# Altium footprint library MercurialSDR.PcbLib: 77 footprints (part 2 of 5)
Each footprint in its own frame and in the unit in brackets; x right, y up, seen from the top. Pads: shape width x height; smd on the part's side, far side on the other; paste and mask are expansions set on the pad; w line width, h text height; cw(c..) or ccw(c..) is an arc to the next point about the centre after c.
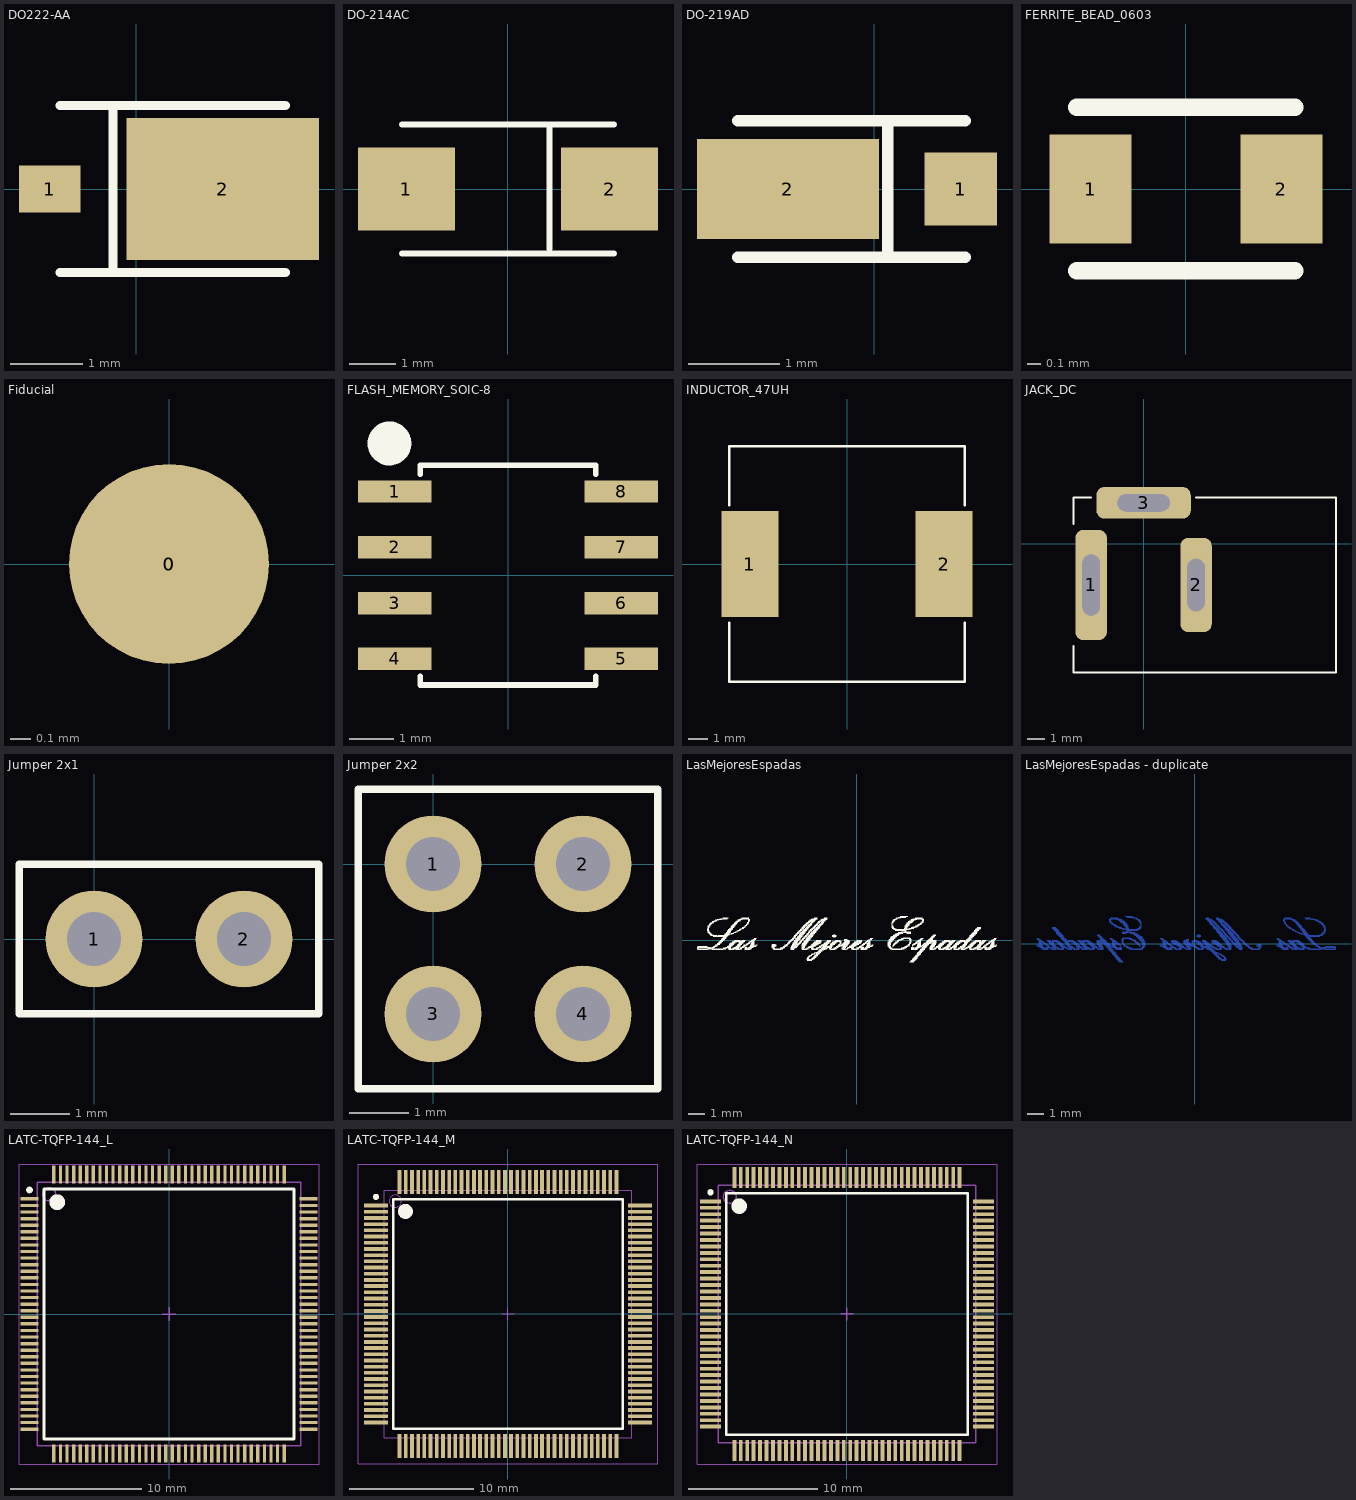
[diagram p1: the footprints below, top view; thin cyan lines are the x and y axes]

## DO222-AA [mm] "Diodo Schottky STPS1L20MF"
pads (2):
  rect 0.85x0.65 smd: 1(-1.19,0)
  rect 2.65x1.95 smd: 2(1.19,0)
Top Overlay:
  lines w0.127: -1.05,-1.15 2.05,-1.15 ; -1.05,1.15 2.05,1.15 ; -0.32,-1.14 -0.32,1.15
3D body "User Library-Diodoshcottkey-DO216-AA.step": height 0.85, standoff 0, extent -1.44,-0.954 2.36,0.955

## DO-214AC [mm] "TVS SMD"
pads (2):
  rect 2.1x1.8 smd: 1(-2.2,0) 2(2.2,0)
Top Overlay:
  lines w0.127: -2.3,-1.4 2.3,-1.4 ; -2.3,1.4 2.3,1.4 ; 0.9,-1.3 0.9,1.4
3D body "User Library-TVS-DO-214AC(SMA).step": height 1.14, standoff -1.14, extent -2.643,-1.397 2.843,1.397

## DO-219AD [mm]
pads (2):
  rect 0.8x0.8 smd: 1(0.95,0)
  rect 2x1.1 smd: 2(-0.95,0)
Top Overlay:
  lines w0.127: -1.5,-0.75 -0.95,-0.75 0.15,-0.75 ; -1.5,0.75 -0.95,0.75 0.15,0.75 ; 1,-0.75 0.15,-0.75 ; 1,0.75 0.15,0.75 ; 0.15,-0.75 0.15,0.75
3D body "User Library-Diodo schottkey MicroSMP-1.STEP": height 0.71, standoff 0.03, extent -1.5,-0.65 1,0.65

## FERRITE_BEAD_0603 [mm] "Ferrite bead 0603"
pads (2):
  rect 0.6x0.8 smd: 1(-0.7,0) 2(0.7,0)
Top Overlay:
  lines w0.127: -0.8,-0.6 0.8,-0.6 ; -0.8,0.6 0.8,0.6
3D body "User Library-FB_1608-1.STEP": height 0.8, standoff 0, extent -0.8,-0.4 0.8,0.4

## Fiducial [mm]
pads (2):
  round 1.5 on Top Solder: 0(0,0)
  round 1 smd: 0(0,0)

## FLASH_MEMORY_SOIC-8 [mm] "Memoria Flash 256kb SOIC-8"
pads (8):
  rect 1.67x0.51 smd: 1(-2.58,1.905) 2(-2.58,0.635) 3(-2.58,-0.635) 4(-2.58,-1.905) 5(2.58,-1.905) 6(2.58,-0.635) 7(2.58,0.635) 8(2.58,1.905)
Top Overlay:
  circle w0.5: c-2.7,3 r0.25
  lines w0.127: -2,-2.3 -2,-2.5 2,-2.5 2,-2.3 ; -2,2.3 -2,2.5 2,2.5 2,2.3
3D body "User Library-PIC16LF18313-SOIC-8.step": height 1.75, standoff 0, extent -2.88,-2.445 3.12,2.455

## INDUCTOR_47UH [mm] "Inductor SMD 47uH"
pads (2):
  rect 2.9x5.4 smd: 1(-4.95,0) 2(4.95,0)
Top Overlay:
  lines w0.127: -6,-3 -6,-6 6,-6 6,-3 ; -6,3 -6,6 6,6 6,3
3D body "Inductor_47uh.stp": height 7.5, standoff 0, extent -6.35,-6.25 6.15,6.25

## JACK_DC [mm] "Conector DC"
pads (3):
  rrect50% 1.8x6.3 hole 1 slot 3.5 at 90 deg unplated: 1(-3,-2.35)
  rrect50% 1.8x5.4 hole 1 slot 3 at 90 deg unplated: 2(3,-2.35)
  rrect50% 5.4x1.8 hole 1 slot 3 at 0 deg unplated: 3(0,2.35)
Top Overlay:
  lines w0.127: -4,-5.85 -4,-7.35 11,-7.35 11,2.65 3,2.65 ; -4,1.15 -4,2.65 -3,2.65
3D body "User Library-Conector DC jack.stp": height 11.5, standoff -3, extent -3.7,-6.85 10.7,2.55

## Jumper 2x1 [mm] "Jumper 2x1"
pads (2):
  round 1.64 hole 0.91: 1(0,0) 2(2.54,0)
Top Overlay:
  lines w0.127: -1.27,-1.27 3.81,-1.27 3.81,1.27 -1.27,1.27 -1.27,-1.27
3D body "User Library-Jumper SL2.STEP": height 9.5, standoff -2.6, extent -1.23,-1.27 3.77,1.27

## Jumper 2x2 [mm] "Jumper 2x2"
pads (4):
  round 1.64 hole 0.91: 1(0,0) 2(2.54,0) 3(0,-2.54) 4(2.54,-2.54)
Top Overlay:
  lines w0.127: -1.27,-3.81 0,-3.81 2.54,-3.81 3.81,-3.81 3.81,1.27 -1.27,1.27 -1.27,-3.81
3D body "User Library-Jumper SL2.STEP": height 9.5, standoff -2.6, extent -1.23,-3.81 3.77,-1.27
3D body "User Library-Jumper SL2.STEP": height 9.5, standoff -2.6, extent -1.23,-1.27 3.77,1.27

## LasMejoresEspadas [mm]
Top Overlay:
  drawing of 752 lines, arcs and shapes, not listed

## LasMejoresEspadas - duplicate [mm]
Bottom Layer:
  lines w0.044: -9.634,-0.067 -9.545,-0.067 ; -9.59,-0.111 -9.234,-0.111 ; -9.59,0.333 -9.457,0.333 ; -9.545,-0.156 -9.19,-0.156 ; -9.545,0.289 -9.412,0.289 ; -9.501,0.244 -9.323,0.244 ; -9.457,-0.067 -9.234,-0.067 ; -9.457,-0.022 -9.279,-0.022 ; -9.457,0.022 -9.279,0.022 ; -9.457,0.067 -9.323,0.067 ; -9.457,0.111 -9.145,0.111 ; -9.457,0.156 -9.19,0.156 ; -9.457,0.2 -9.279,0.2 ; -9.412,-0.2 -9.145,-0.2 ; -9.323,-0.245 -9.101,-0.245 ; -9.279,-0.289 -8.879,-0.289 ; -9.234,0.067 -9.101,0.067 ; -9.19,-0.333 -8.879,-0.333 ; -9.19,0.022 -9.012,0.022 ; -9.101,-0.022 -8.968,-0.022 ; -9.057,-0.245 -8.879,-0.245 ; -9.057,-0.2 -8.701,-0.2 ; -9.057,-0.067 -8.879,-0.067 ; -8.968,-0.111 -8.834,-0.111 ; -8.968,0.2 -8.745,0.2 ; -8.923,-0.156 -8.79,-0.156 ; -8.923,0.156 -8.701,0.156 ; -8.879,0.111 -8.568,0.111 ; -8.834,0.067 -8.568,0.067 ; -8.79,-0.245 -8.656,-0.245 ; -8.79,0.022 -8.568,0.022 ; -8.745,-0.289 -8.39,-0.289 ; -8.745,-0.022 -8.523,-0.022 ; -8.701,-0.067 -8.479,-0.067 ; -8.656,-0.333 -8.39,-0.333 ; -8.656,-0.156 -8.39,-0.156 ; -8.656,-0.111 -8.434,-0.111 ; -8.656,0.156 -8.212,0.156 ; -8.656,0.2 -8.301,0.2 ; -8.656,0.956 -8.39,0.956 ; -8.656,1 -8.434,1 ; -8.612,-0.2 -8.301,-0.2 ; -8.612,0.911 -8.345,0.911 ; -8.568,-0.245 -8.212,-0.245 ; -8.568,0.867 -8.301,0.867 ; -8.523,0.822 -8.256,0.822 ; -8.479,0.778 -8.256,0.778 ; -8.434,0.111 -8.168,0.111 ; -8.434,0.733 -8.212,0.733 ; -8.39,0.644 -8.123,0.644 ; -8.39,0.689 -8.168,0.689 ; -8.345,-0.289 -7.945,-0.289 ; -8.345,0.067 -8.079,0.067 ; -8.345,0.6 -8.079,0.6 ; -8.301,0.022 -8.034,0.022 ; -8.301,0.556 -8.034,0.556 ; -8.256,-0.333 -7.99,-0.333 ; -8.256,-0.022 -7.99,-0.022 ; -8.256,0.511 -7.99,0.511 ; -8.212,-0.067 -7.99,-0.067 ; -8.212,0.467 -7.99,0.467 ; -8.168,-0.111 -7.901,-0.111 ; -8.168,0.422 -7.945,0.422 ; -8.123,-0.156 -7.856,-0.156 ; -8.123,0.378 -7.901,0.378 ; -8.079,-0.245 -7.945,-0.245 ; -8.079,-0.2 -7.767,-0.2 ; -8.079,0.289 -7.812,0.289 ; -8.079,0.333 -7.856,0.333 ; -8.034,0.244 -7.767,0.244 ; -7.99,0.2 -7.723,0.2 ; -7.945,0.156 -7.279,0.156 ; -7.901,0.111 -7.634,0.111 ; -7.856,-0.245 -7.679,-0.245 ; -7.856,0.067 -7.634,0.067 ; -7.812,-0.022 -7.59,-0.022 ; -7.812,0.022 -7.634,0.022 ; -7.767,-0.289 -7.456,-0.289 ; -7.767,-0.067 -7.545,-0.067 ; -7.723,-0.111 -7.501,-0.111 ; -7.679,-0.333 -7.456,-0.333 ; -7.679,-0.156 -7.412,-0.156 ; -7.679,0.2 -7.367,0.2 ; -7.634,-0.2 -7.367,-0.2 ; -7.59,-0.245 -7.279,-0.245 ; -7.501,0.111 -7.19,0.111 ; -7.412,-0.289 -7.012,-0.289 ; -7.412,0.067 -7.145,0.067 ; -7.367,0.022 -7.101,0.022 ; -7.323,-0.333 -7.012,-0.333 ; -7.323,-0.022 -7.056,-0.022 ; -7.234,-0.067 -7.012,-0.067 ; -7.19,-0.156 -6.923,-0.156 ; -7.19,-0.111 -6.967,-0.111 ; -7.145,-0.2 -6.834,-0.2 ; -7.101,-0.245 -7.012,-0.245 ; -7.101,0.2 -6.878,0.2 ; -7.056,0.156 -6.834,0.156 ; -7.012,0.111 -6.701,0.111 ; -6.967,0.067 -6.701,0.067 ; -6.923,-0.245 -6.79,-0.245 ; -6.923,0.022 -6.701,0.022 ; -6.878,-0.289 -6.523,-0.289 ; -6.878,-0.022 -6.656,-0.022 ; -6.834,-0.067 -6.612,-0.067 ; -6.79,-0.333 -6.523,-0.333 ; -6.79,-0.156 -6.523,-0.156 ; -6.79,-0.111 -6.567,-0.111 ; -6.79,0.156 -6.345,0.156 ; -6.79,0.2 -6.434,0.2 ; -6.745,-0.2 -6.434,-0.2 ; -6.701,-0.245 -6.345,-0.245 ; -6.567,0.111 -6.301,0.111 ; -6.478,-0.289 -6.078,-0.289 ; -6.478,0.067 -6.212,0.067 ; -6.434,0.022 -6.167,0.022 ; -6.39,-0.333 -6.123,-0.333 ; -6.39,-0.022 -6.123,-0.022 ; -6.345,-0.067 -6.078,-0.067 ; -6.301,-0.111 -6.034,-0.111 ; -6.256,-0.156 -5.945,-0.156 ; -6.212,-0.245 -6.078,-0.245 ; -6.212,-0.2 -5.901,-0.2 ; -5.989,-0.245 -5.812,-0.245 ; -5.945,0.067 -5.723,0.067 ; -5.945,0.111 -5.767,0.111 ; -5.945,0.156 -5.367,0.156 ; -5.945,0.2 -5.678,0.2 ; -5.901,-0.289 -5.545,-0.289 ; -5.901,-0.022 -5.678,-0.022 ; -5.901,0.022 -5.678,0.022 ; -5.901,0.511 -5.723,0.511 ; -5.901,0.556 -5.767,0.556 ; -5.856,-0.111 -5.589,-0.111 ; -5.856,-0.067 -5.634,-0.067 ; -5.856,0.467 -5.678,0.467 ; -5.812,-0.333 -5.545,-0.333 ; -5.812,-0.156 -5.589,-0.156 ; -5.812,0.422 -5.634,0.422 ; -5.767,-0.2 -5.545,-0.2 ; -5.767,0.378 -5.589,0.378 ; -5.723,-0.245 -5.545,-0.245 ; -5.723,0.111 -5.323,0.111 ; -5.723,0.289 -5.501,0.289 ; -5.723,0.333 -5.545,0.333 ; -5.678,0.244 -5.456,0.244 ; -5.634,0.067 -5.234,0.067 ; -5.634,0.2 -5.412,0.2 ; -5.589,0.022 -5.189,0.022 ; -5.501,-0.022 -5.145,-0.022 ; -5.456,-0.067 -5.1,-0.067 ; -5.412,-0.111 -4.789,-0.111 ; -5.367,-0.156 -5.145,-0.156 ; -5.323,-0.2 -5.1,-0.2 ; -5.278,-0.245 -5.056,-0.245 ; -5.234,-0.333 -4.967,-0.333 ; -5.234,-0.289 -5.012,-0.289 ; -5.189,-0.378 -4.967,-0.378 ; -5.189,1.4 -5.1,1.4 ; -5.189,1.445 -5.1,1.445 ; -5.189,1.489 -5.056,1.489 ; -5.145,-0.422 -4.923,-0.422 ; -5.145,0.333 -5.012,0.333 ; -5.145,1.311 -5.056,1.311 ; -5.145,1.356 -5.056,1.356 ; -5.145,1.533 -4.523,1.533 ; -5.1,-0.467 -4.878,-0.467 ; -5.1,-0.156 -4.745,-0.156 ; -5.1,0.289 -4.967,0.289 ; -5.1,1.267 -4.967,1.267 ; -5.1,1.578 -4.656,1.578 ; -5.056,-0.511 -4.834,-0.511 ; -5.056,0.244 -4.878,0.244 ; -5.056,1.222 -4.923,1.222 ; -5.012,-0.6 -4.745,-0.6 ; -5.012,-0.556 -4.789,-0.556 ; -5.012,-0.067 -4.789,-0.067 ; -5.012,-0.022 -4.834,-0.022 ; -5.012,0.022 -4.834,0.022 ; -5.012,0.067 -4.878,0.067 ; -5.012,0.111 -4.7,0.111 ; -5.012,0.156 -4.745,0.156 ; -5.012,0.2 -4.834,0.2 ; -5.012,1.178 -4.834,1.178 ; -4.967,-0.645 -4.745,-0.645 ; -4.967,-0.2 -4.7,-0.2 ; -4.923,-0.689 -4.7,-0.689 ; -4.923,1.133 -4.745,1.133 ; -4.878,-0.733 -4.656,-0.733 ; -4.878,-0.245 -4.656,-0.245 ; -4.878,1.089 -4.656,1.089 ; -4.834,-0.778 -4.612,-0.778 ; -4.834,-0.289 -4.434,-0.289 ; -4.789,-0.867 -4.523,-0.867 ; -4.789,-0.822 -4.567,-0.822 ; -4.789,0.067 -4.656,0.067 ; -4.789,1.045 -4.523,1.045 ; -4.745,-0.911 -4.523,-0.911 ; -4.745,-0.333 -4.434,-0.333 ; -4.745,0.022 -4.567,0.022 ; -4.745,1.489 -4.434,1.489 ; -4.7,-0.956 -4.478,-0.956 ; -4.656,-1 -4.434,-1 ; -4.656,-0.022 -4.523,-0.022 ; -4.656,1 -4.434,1 ; -4.656,1.445 -4.389,1.445 ; -4.612,-1.045 -4.389,-1.045 ; -4.612,-0.245 -4.434,-0.245 ; -4.612,-0.2 -4.434,-0.2 ; -4.612,-0.067 -4.478,-0.067 ; -4.567,-1.089 -4.345,-1.089 ; -4.567,0.956 -4.3,0.956 ; -4.567,1.4 -4.3,1.4 ; -4.523,-0.111 -4.478,-0.111 ; -4.523,1.356 -4.256,1.356 ; -4.478,1.311 -4.211,1.311 ; -4.434,0.111 -4.345,0.111 ; -4.434,0.156 -4.345,0.156 ; -4.434,0.2 -4.345,0.2 ; -4.434,0.244 -4.345,0.244 ; -4.434,0.289 -4.3,0.289 ; -4.434,0.911 -3.989,0.911 ; -4.434,1.267 -4.167,1.267 ; -4.389,0.022 -4.3,0.022 ; -4.389,0.067 -4.3,0.067 ; -4.389,0.333 -3.811,0.333 ; -4.389,0.644 -4.167,0.644 ; -4.389,0.689 -3.634,0.689 ; -4.389,0.733 -3.811,0.733 ; -4.345,-0.067 -4.211,-0.067 ; -4.345,-0.022 -4.256,-0.022 ; -4.345,0.378 -3.945,0.378 ; -4.345,1.222 -4.123,1.222 ; -4.3,-0.111 -4.123,-0.111 ; -4.3,0.867 -3.367,0.867 ; -4.3,1.133 -4.078,1.133 ; -4.3,1.178 -4.078,1.178 ; -4.256,1.089 -4.034,1.089 ; -4.211,-0.156 -4.034,-0.156 ; -4.211,1.045 -4.034,1.045 ; -4.211,1.667 -3.767,1.667 ; -4.167,-0.2 -3.945,-0.2 ; -4.167,0.956 -3.989,0.956 ; -4.167,1 -4.034,1 ; -4.123,0.778 -4.034,0.778 ; -4.123,0.822 -3.456,0.822 ; -4.078,-0.245 -3.811,-0.245 ; -4.078,1.622 -3.634,1.622 ; -3.989,-0.289 -3.145,-0.289 ; -3.945,0.289 -3.723,0.289 ; -3.9,0.644 -3.545,0.644 ; -3.856,-0.333 -3.234,-0.333 ; -3.856,0.244 -3.634,0.244 ; -3.767,0.2 -3.589,0.2 ; -3.767,0.6 -3.456,0.6 ; -3.767,1.578 -3.5,1.578 ; -3.678,0.156 -3.545,0.156 ; -3.678,0.556 -3.367,0.556 ; -3.634,0.111 -3.456,0.111 ; -3.634,0.511 -3.322,0.511 ; -3.589,0.067 -3.411,0.067 ; -3.589,1.533 -3.456,1.533 ; -3.545,0.467 -3.234,0.467 ; -3.5,0.022 -3.367,0.022 ; -3.5,0.422 -3.189,0.422 ; -3.5,0.911 -3.322,0.911 ; -3.5,1.489 -3.367,1.489 ; -3.456,-0.022 -3.322,-0.022 ; -3.456,0.378 -3.145,0.378 ; -3.456,1.445 -3.322,1.445 ; -3.411,-0.067 -3.322,-0.067 ; -3.411,0.333 -3.145,0.333 ; -3.411,0.956 -3.278,0.956 ; -3.411,1.4 -3.278,1.4 ; -3.367,-0.111 -3.278,-0.111 ; -3.367,0.289 -3.1,0.289 ; -3.367,1 -3.234,1 ; -3.367,1.356 -3.278,1.356 ; -3.322,0.244 -3.056,0.244 ; -3.322,1.045 -3.234,1.045 ; -3.322,1.089 -3.234,1.089 ; -3.322,1.267 -3.234,1.267 ; -3.322,1.311 -3.234,1.311 ; -3.278,-0.245 -3.1,-0.245 ; -3.278,0.156 -3.056,0.156 ; -3.278,0.2 -3.056,0.2 ; -3.278,1.133 -3.234,1.133 ; -3.278,1.178 -3.234,1.178 ; -3.278,1.222 -3.234,1.222 ; -3.234,0.111 -3.011,0.111 ; -3.189,-0.2 -3.056,-0.2 ; -3.189,-0.156 -3.056,-0.156 ; -3.189,-0.022 -3.011,-0.022 ; -3.189,0.022 -3.011,0.022 ; -3.189,0.067 -3.011,0.067 ; -3.145,-0.111 -3.011,-0.111 ; -3.145,-0.067 -3.011,-0.067 ; -2.122,-0.067 -2.033,-0.067 ; -2.078,-0.111 -1.722,-0.111 ; -2.078,0.333 -1.945,0.333 ; -2.033,-0.156 -1.678,-0.156 ; -2.033,0.289 -1.9,0.289 ; -1.989,0.244 -1.811,0.244 ; -1.945,-0.067 -1.722,-0.067 ; -1.945,-0.022 -1.767,-0.022 ; -1.945,0.022 -1.767,0.022 ; -1.945,0.067 -1.811,0.067 ; -1.945,0.111 -1.633,0.111 ; -1.945,0.156 -1.678,0.156 ; -1.945,0.2 -1.767,0.2 ; -1.9,-0.2 -1.633,-0.2 ; -1.811,-0.245 -1.589,-0.245 ; -1.767,-0.289 -1.367,-0.289 ; -1.722,0.067 -1.589,0.067 ; -1.678,-0.333 -1.367,-0.333 ; -1.678,0.022 -1.5,0.022 ; -1.589,-0.022 -1.456,-0.022 ; -1.544,-0.245 -1.367,-0.245 ; -1.544,-0.2 -1.189,-0.2 ; -1.544,-0.067 -1.411,-0.067 ; -1.5,-0.111 -1.322,-0.111 ; -1.411,-0.156 -1.278,-0.156 ; -1.411,0.111 -1.278,0.111 ; -1.411,0.156 -1.056,0.156 ; -1.411,0.2 -1.1,0.2 ; -1.367,0.067 -1.233,0.067 ; -1.322,0.022 -0.878,0.022 ; -1.278,-0.245 -1.1,-0.245 ; -1.233,-0.289 -0.789,-0.289 ; -1.233,-0.022 -0.833,-0.022 ; -1.233,0.111 -0.967,0.111 ; -1.189,0.067 -0.922,0.067 ; -1.144,-0.333 -0.833,-0.333 ; -1.144,-0.067 -0.789,-0.067 ; -1.056,-0.111 -0.7,-0.111 ; -0.967,-0.156 -0.655,-0.156 ; -0.922,-0.245 -0.789,-0.245 ; -0.922,-0.2 -0.789,-0.2 ; -0.744,-0.2 -0.567,-0.2 ; -0.7,0.111 -0.344,0.111 ; -0.7,0.156 -0.389,0.156 ; -0.655,-0.245 -0.522,-0.245 ; -0.655,0.022 -0.255,0.022 ; -0.655,0.067 -0.3,0.067 ; -0.655,0.2 -0.344,0.2 ; -0.611,-0.022 -0.211,-0.022 ; -0.567,-0.289 -0.211,-0.289 ; -0.567,-0.067 0.011,-0.067 ; -0.522,-0.111 -0.3,-0.111 ; -0.522,0.244 -0.344,0.244 ; -0.522,0.289 -0.344,0.289 ; -0.478,-0.333 -0.255,-0.333 ; -0.478,-0.156 -0.255,-0.156 ; -0.433,-0.2 -0.255,-0.2 ; -0.389,-0.245 -0.211,-0.245 ; -0.255,-0.111 0.056,-0.111 ; -0.167,0.022 -0.078,0.022 ; -0.167,0.067 -0.078,0.067 ; -0.167,0.111 -0.078,0.111 ; -0.167,0.156 0.278,0.156 ; -0.122,-0.022 -0.033,-0.022 ; -0.122,0.2 0.189,0.2 ; -0.078,-0.156 0.145,-0.156 ; 0.011,-0.2 0.189,-0.2 ; 0.056,-0.245 0.278,-0.245 ; 0.056,0.111 0.367,0.111 ; 0.145,-0.289 0.545,-0.289 ; 0.145,0.067 0.411,0.067 ; 0.145,0.467 0.367,0.467 ; 0.145,0.511 0.367,0.511 ; 0.189,0.022 0.456,0.022 ; 0.189,0.422 0.322,0.422 ; 0.189,0.556 0.322,0.556 ; 0.234,-0.333 0.5,-0.333 ; 0.234,-0.022 0.5,-0.022 ; 0.322,-0.067 0.5,-0.067 ; 0.367,-0.156 0.678,-0.156 ; 0.367,-0.111 0.589,-0.111 ; 0.411,-0.2 0.545,-0.2 ; 0.456,-0.245 0.545,-0.245 ; 0.456,0.156 0.722,0.156 ; 0.456,0.2 0.678,0.2 ; 0.5,0.111 0.767,0.111 ; 0.545,0.067 0.856,0.067 ; 0.589,-0.2 0.722,-0.2 ; 0.589,0.022 0.9,0.022 ; 0.634,-0.245 1.034,-0.245 ; 0.634,-0.022 0.945,-0.022 ; 0.678,-0.067 1.034,-0.067 ; 0.678,1.533 0.945,1.533 ; 0.678,1.578 0.856,1.578 ; 0.722,-0.289 1.078,-0.289 ; 0.722,-0.156 0.945,-0.156 ; 0.722,-0.111 1.123,-0.111 ; 0.722,1.489 1.034,1.489 ; 0.767,-0.2 0.989,-0.2 ; 0.767,1.445 1.078,1.445 ; 0.811,-0.333 1.123,-0.333 ; 0.811,1.4 0.945,1.4 ; 0.856,1.356 0.989,1.356 ; 0.9,-0.378 1.167,-0.378 ; 0.9,1.267 1.078,1.267 ; 0.9,1.311 1.034,1.311 ; 0.945,1.222 1.123,1.222 ; 0.989,-0.422 1.211,-0.422 ; 0.989,1.178 1.167,1.178 ; 0.989,1.4 1.167,1.4 ; 1.034,-0.467 1.256,-0.467 ; 1.034,-0.156 1.167,-0.156 ; 1.034,0.111 1.167,0.111 ; 1.034,0.156 1.389,0.156 ; 1.034,0.2 1.345,0.2 ; 1.034,1.133 1.211,1.133 ; 1.034,1.356 1.211,1.356 ; 1.078,-0.511 1.389,-0.511 ; 1.078,-0.2 1.256,-0.2 ; 1.078,0.067 1.211,0.067 ; 1.078,1.089 1.256,1.089 ; 1.123,-0.556 1.478,-0.556 ; 1.123,0.022 1.567,0.022 ; 1.123,1 1.345,1 ; 1.123,1.045 1.3,1.045 ; 1.123,1.311 1.256,1.311 ; 1.167,-0.6 1.345,-0.6 ; 1.167,-0.245 1.345,-0.245 ; 1.167,0.956 1.389,0.956 ; 1.167,1.267 1.3,1.267 ; 1.211,-0.645 1.389,-0.645 ; 1.211,-0.289 1.656,-0.289 ; 1.211,-0.022 1.611,-0.022 ; 1.211,0.111 1.478,0.111 ; 1.211,0.911 1.434,0.911 ; 1.211,1.222 1.345,1.222 ; 1.256,-0.689 1.434,-0.689 ; 1.256,0.067 1.523,0.067 ; 1.256,0.867 1.478,0.867 ; 1.256,1.178 1.389,1.178 ; 1.3,-0.733 1.478,-0.733 ; 1.3,-0.333 1.611,-0.333 ; 1.3,-0.067 1.656,-0.067 ; 1.3,0.822 1.523,0.822 ; 1.3,1.133 1.434,1.133 ; 1.3,1.533 1.611,1.533 ; 1.3,1.578 1.478,1.578 ; 1.345,-0.778 1.523,-0.778 ; 1.345,0.733 1.611,0.733 ; 1.345,0.778 1.567,0.778 ; 1.345,1.089 1.478,1.089 ; 1.345,1.489 1.656,1.489 ; 1.389,-0.822 1.567,-0.822 ; 1.389,-0.111 1.7,-0.111 ; 1.389,0.689 1.656,0.689 ; 1.389,1.045 1.523,1.045 ; 1.389,1.445 1.745,1.445 ; 1.434,-0.867 1.611,-0.867 ; 1.434,-0.6 1.611,-0.6 ; 1.434,0.644 1.7,0.644 ; 1.434,1 1.567,1 ; 1.434,1.4 1.789,1.4 ; 1.478,-0.911 1.656,-0.911 ; 1.478,-0.156 1.789,-0.156 ; 1.478,0.6 1.745,0.6 ; 1.478,0.956 1.611,0.956 ; 1.478,1.356 1.611,1.356 ; 1.523,-0.645 1.656,-0.645 ; 1.523,-0.245 1.656,-0.245 ; 1.523,-0.2 1.834,-0.2 ; 1.523,0.511 1.789,0.511 ; 1.523,0.556 1.745,0.556 ; 1.523,0.911 1.656,0.911 ; 1.523,1.311 1.656,1.311 ; 1.567,-0.956 1.923,-0.956 ; 1.567,0.467 1.834,0.467 ; 1.567,0.867 1.7,0.867 ; 1.567,1.267 1.7,1.267 ; 1.611,-1 1.878,-1 ; 1.611,-0.689 1.745,-0.689 ; 1.611,0.422 1.878,0.422 ; 1.611,0.822 1.745,0.822 ; 1.611,1.178 1.789,1.178 ; 1.611,1.222 1.745,1.222 ; 1.656,-0.733 1.789,-0.733 ; 1.656,0.378 1.923,0.378 ; 1.656,0.778 1.789,0.778 ; 1.656,1.133 1.834,1.133 ; 1.656,1.356 1.834,1.356 ; 1.7,0.289 1.967,0.289 ; 1.7,0.333 1.967,0.333 ; 1.7,0.733 1.789,0.733 ; 1.7,1.089 1.878,1.089 ; 1.745,-0.778 1.834,-0.778 ; 1.745,-0.245 1.923,-0.245 ; 1.745,0.244 2.012,0.244 ; 1.745,0.689 1.834,0.689 ; 1.745,1.045 1.923,1.045 ; 1.745,1.311 1.878,1.311 ; 1.789,-0.867 1.878,-0.867 ; 1.789,-0.822 1.878,-0.822 ; 1.789,0.2 2.056,0.2 ; 1.789,0.6 1.923,0.6 ; 1.789,0.644 1.878,0.644 ; 1.789,1 1.967,1 ; 1.789,1.267 1.967,1.267 ; 1.834,-0.911 1.923,-0.911 ; 1.834,-0.289 2.234,-0.289 ; 1.834,0.111 2.1,0.111 ; 1.834,0.156 2.1,0.156 ; 1.834,0.556 1.967,0.556 ; 1.834,0.911 2.056,0.911 ; 1.834,0.956 2.012,0.956 ; 1.834,1.222 2.012,1.222 ; 1.878,0.067 2.145,0.067 ; 1.878,0.511 2.012,0.511 ; 1.878,0.867 2.1,0.867 ; 1.878,1.178 2.056,1.178 ; 1.923,-0.333 2.189,-0.333 ; 1.923,0.022 2.189,0.022 ; 1.923,0.467 2.056,0.467 ; 1.923,0.822 2.145,0.822 ; 1.923,1.133 2.1,1.133 ; 1.967,-0.067 2.234,-0.067 ; 1.967,-0.022 2.189,-0.022 ; 1.967,0.422 2.1,0.422 ; 1.967,0.778 2.189,0.778 ; 1.967,1.089 2.145,1.089 ; 2.012,-0.111 2.234,-0.111 ; 2.012,0.378 2.145,0.378 ; 2.012,0.689 2.278,0.689 ; 2.012,0.733 2.234,0.733 ; 2.012,1.045 2.189,1.045 ; 2.056,-0.2 2.234,-0.2 ; 2.056,-0.156 2.234,-0.156 ; 2.056,0.333 2.189,0.333 ; 2.056,0.644 2.323,0.644 ; 2.056,1 2.234,1 ; 2.1,-0.245 2.234,-0.245 ; 2.1,0.289 2.234,0.289 ; 2.1,0.6 2.367,0.6 ; 2.1,0.956 2.234,0.956 ; 2.145,0.244 2.234,0.244 ; 2.145,0.556 2.367,0.556 ; 2.145,0.911 2.278,0.911 ; 2.189,0.2 2.278,0.2 ; 2.189,0.467 2.456,0.467 ; 2.189,0.511 2.412,0.511 ; 2.189,0.867 2.323,0.867 ; 2.234,0.111 2.367,0.111 ; 2.234,0.156 2.323,0.156 ; 2.234,0.422 2.5,0.422 ; 2.234,0.822 2.367,0.822 ; 2.278,0.067 2.412,0.067 ; 2.278,0.378 2.545,0.378 ; 2.278,0.778 2.412,0.778 ; 2.323,0.022 2.456,0.022 ; 2.323,0.289 2.589,0.289 ; 2.323,0.333 2.589,0.333 ; 2.323,0.733 2.456,0.733 ; 2.367,-0.022 2.5,-0.022 ; 2.367,0.244 2.634,0.244 ; 2.367,0.689 2.5,0.689 ; 2.412,-0.067 2.545,-0.067 ; 2.412,0.2 2.678,0.2 ; 2.412,0.644 2.545,0.644 ; 2.456,-0.111 2.589,-0.111 ; 2.456,0.111 2.723,0.111 ; 2.456,0.156 2.678,0.156 ; 2.456,0.6 2.589,0.6 ; 2.5,-0.156 2.856,-0.156 ; 2.5,0.067 2.767,0.067 ; 2.5,0.556 2.634,0.556 ; 2.545,-0.2 2.901,-0.2 ; 2.545,-0.022 2.812,-0.022 ; 2.545,0.022 2.767,0.022 ; 2.545,0.511 2.678,0.511 ; 2.589,-0.067 2.812,-0.067 ; 2.589,0.422 2.723,0.422 ; 2.589,0.467 2.723,0.467 ; 2.634,-0.245 2.901,-0.245 ; 2.634,-0.111 2.856,-0.111 ; 2.634,0.378 2.767,0.378 ; 2.678,-0.289 2.901,-0.289 ; 2.678,0.333 2.812,0.333 ; 2.723,-0.333 2.901,-0.333 ; 2.723,0.289 2.856,0.289 ; 2.767,0.244 2.901,0.244 ; 2.812,0.2 2.945,0.2 ; 2.856,0.156 2.989,0.156 ; 2.901,0.111 3.034,0.111 ; 2.945,0.067 3.078,0.067 ; 2.989,0.022 3.123,0.022 ; 3.034,-0.022 3.167,-0.022 ; 3.078,-0.067 3.256,-0.067 ; 3.123,-0.111 3.301,-0.111 ; 3.212,-0.156 3.345,-0.156 ; 3.256,-0.2 3.434,-0.2 ; 3.301,-0.245 3.523,-0.245 ; 3.389,-0.289 3.967,-0.289 ; 3.478,-0.333 3.923,-0.333 ; 3.79,-0.111 4.056,-0.111 ; 3.79,-0.067 4.056,-0.067 ; 3.834,-0.156 4.056,-0.156 ; 3.834,-0.022 4.012,-0.022 ; 3.878,-0.245 4.012,-0.245 ; 3.923,-0.2 4.056,-0.2 ; 4.945,-0.067 5.034,-0.067 ; 4.99,-0.111 5.345,-0.111 ; 4.99,0.333 5.123,0.333 ; 5.034,-0.156 5.39,-0.156 ; 5.034,0.289 5.167,0.289 ; 5.079,0.244 5.256,0.244 ; 5.123,-0.067 5.345,-0.067 ; 5.123,-0.022 5.301,-0.022 ; 5.123,0.022 5.301,0.022 ; 5.123,0.067 5.256,0.067 ; 5.123,0.111 5.434,0.111 ; 5.123,0.156 5.39,0.156 ; 5.123,0.2 5.301,0.2 ; 5.167,-0.2 5.434,-0.2 ; 5.256,-0.245 5.479,-0.245 ; 5.301,-0.289 5.701,-0.289 ; 5.345,0.067 5.479,0.067 ; 5.39,-0.333 5.701,-0.333 ; 5.39,0.022 5.568,0.022 ; 5.39,1.4 5.479,1.4 ; 5.39,1.445 5.479,1.445 ; 5.39,1.489 5.479,1.489 ; 5.434,1.267 5.523,1.267 ; 5.434,1.311 5.523,1.311 ; 5.434,1.356 5.479,1.356 ; 5.434,1.533 5.968,1.533 ; 5.434,1.578 5.879,1.578 ; 5.479,-0.022 5.612,-0.022 ; 5.479,1.222 5.568,1.222 ; 5.523,-0.245 5.701,-0.245 ; 5.523,-0.2 5.701,-0.2 ; 5.523,-0.067 5.745,-0.067 ; 5.523,1.178 5.612,1.178 ; 5.568,1.133 5.656,1.133 ; 5.612,-0.111 5.79,-0.111 ; 5.612,1.089 5.701,1.089 ; 5.656,0.2 5.879,0.2 ; 5.656,1.045 5.745,1.045 ; 5.701,-0.156 5.834,-0.156 ; 5.701,0.156 5.923,0.156 ; 5.701,1 5.834,1 ; 5.745,-0.2 5.923,-0.2 ; 5.745,0.111 6.056,0.111 ; 5.745,0.956 5.879,0.956 ; 5.79,0.067 6.056,0.067 ; 5.834,-0.245 5.968,-0.245 ; 5.834,0.022 6.056,0.022 ; 5.834,0.911 5.968,0.911 ; 5.834,1.489 6.056,1.489 ; 5.879,-0.289 6.234,-0.289 ; 5.879,-0.022 6.101,-0.022 ; 5.923,-0.067 6.145,-0.067 ; 5.923,0.867 6.012,0.867 ; 5.923,1.445 6.101,1.445 ; 5.968,-0.333 6.234,-0.333 ; 5.968,-0.156 6.234,-0.156 ; 5.968,-0.111 6.19,-0.111 ; 5.968,0.156 6.412,0.156 ; 5.968,0.2 6.323,0.2 ; 5.968,0.822 6.101,0.822 ; 5.968,1.4 6.19,1.4 ; 6.012,-0.2 6.323,-0.2 ; 6.056,-0.245 6.412,-0.245 ; 6.056,0.778 6.19,0.778 ; 6.056,1.356 6.234,1.356 ; 6.101,1.311 6.279,1.311 ; 6.145,0.733 6.279,0.733 ; 6.145,1.267 6.323,1.267 ; 6.19,0.111 6.457,0.111 ; 6.19,1.222 6.368,1.222 ; 6.234,0.689 6.368,0.689 ; 6.234,1.178 6.412,1.178 ; 6.279,-0.289 6.679,-0.289 ; 6.279,0.067 6.545,0.067 ; 6.279,1.089 6.501,1.089 ; 6.279,1.133 6.457,1.133 ; 6.323,0.022 6.59,0.022 ; 6.323,1.045 6.545,1.045 ; 6.368,-0.333 6.634,-0.333 ; 6.368,-0.022 6.634,-0.022 ; 6.368,0.644 6.501,0.644 ; 6.368,1 6.545,1 ; 6.412,-0.067 6.634,-0.067 ; 6.412,0.911 6.634,0.911 ; 6.412,0.956 6.59,0.956 ; 6.457,-0.111 6.679,-0.111 ; 6.457,0.6 6.901,0.6 ; 6.457,0.867 6.679,0.867 ; 6.501,-0.156 6.768,-0.156 ; 6.501,0.822 6.723,0.822 ; 6.545,-0.245 6.679,-0.245 ; 6.545,-0.2 6.857,-0.2 ; 6.545,0.733 6.768,0.733 ; 6.545,0.778 6.768,0.778 ; 6.59,0.689 6.812,0.689 ; 6.634,0.556 6.945,0.556 ; 6.634,0.644 6.857,0.644 ; 6.679,1.578 7.034,1.578 ; 6.723,0.511 7.301,0.511 ; 6.768,-0.245 6.99,-0.245 ; 6.768,0.467 7.612,0.467 ; 6.768,1.533 7.212,1.533 ; 6.812,0.378 7.034,0.378 ; 6.812,0.422 6.99,0.422 ; 6.857,-0.289 8.59,-0.289 ; 6.857,0.333 7.079,0.333 ; 6.901,0.289 7.123,0.289 ; 6.945,0.244 7.123,0.244 ; 6.99,-0.333 7.657,-0.333 ; 6.99,0.2 7.168,0.2 ; 7.034,0.156 7.212,0.156 ; 7.079,0.111 7.257,0.111 ; 7.079,1.489 7.346,1.489 ; 7.123,0.067 7.301,0.067 ; 7.168,0.022 7.346,0.022 ; 7.212,-0.022 7.39,-0.022 ; 7.257,1.445 7.479,1.445 ; 7.301,-0.067 7.479,-0.067 ; 7.346,-0.111 7.523,-0.111 ; 7.346,0.511 7.746,0.511 ; 7.39,1.4 7.568,1.4 ; 7.434,-0.156 7.612,-0.156 ; 7.479,1.356 7.657,1.356 ; 7.523,-0.2 7.701,-0.2 ; 7.568,1.311 7.701,1.311 ; 7.612,-0.245 7.923,-0.245 ; 7.612,0.556 7.79,0.556 ; 7.612,1.267 7.79,1.267 ; 7.701,0.6 7.834,0.6 ; 7.701,1.222 7.834,1.222 ; 7.746,0.644 7.879,0.644 ; 7.746,1.178 7.834,1.178 ; 7.79,-0.2 8.323,-0.2 ; 7.79,0.689 7.923,0.689 ; 7.79,1.089 7.923,1.089 ; 7.79,1.133 7.879,1.133 ; 7.834,0.733 7.923,0.733 ; 7.834,0.778 7.923,0.778 ; 7.834,1 7.923,1 ; 7.834,1.045 7.923,1.045 ; 7.879,0.822 7.968,0.822 ; 7.879,0.867 7.968,0.867 ; 7.879,0.911 7.968,0.911 ; 7.879,0.956 7.923,0.956 ; 7.923,-0.333 8.546,-0.333 ; 7.968,-0.156 8.546,-0.156 ; 8.368,-0.2 8.59,-0.2 ; 8.501,-0.245 8.59,-0.245

## LATC-TQFP-144 [mm] "TQFP de la ICE40"

## LATC-TQFP-144_L [mm] "QFP, 144-Leads, Body 20x20mm, Pitch 0.5mm, IPC High Density"
height 1.6
pads (144):
  rect 1.4x0.25 smd: 1(-10.6,8.75) 2(-10.6,8.25) 3(-10.6,7.75) 4(-10.6,7.25) 5(-10.6,6.75) 6(-10.6,6.25) 7(-10.6,5.75) 8(-10.6,5.25) 9(-10.6,4.75) 10(-10.6,4.25) 11(-10.6,3.75) 12(-10.6,3.25) 13(-10.6,2.75) 14(-10.6,2.25) 15(-10.6,1.75) 16(-10.6,1.25) 17(-10.6,0.75) 18(-10.6,0.25) 19(-10.6,-0.25) 20(-10.6,-0.75) 21(-10.6,-1.25) 22(-10.6,-1.75) 23(-10.6,-2.25) 24(-10.6,-2.75) 25(-10.6,-3.25) 26(-10.6,-3.75) 27(-10.6,-4.25) 28(-10.6,-4.75) 29(-10.6,-5.25) 30(-10.6,-5.75) 31(-10.6,-6.25) 32(-10.6,-6.75) 33(-10.6,-7.25) 34(-10.6,-7.75) 35(-10.6,-8.25) 36(-10.6,-8.75) 73(10.6,-8.75) 74(10.6,-8.25) 75(10.6,-7.75) 76(10.6,-7.25) 77(10.6,-6.75) 78(10.6,-6.25) 79(10.6,-5.75) 80(10.6,-5.25) 81(10.6,-4.75) 82(10.6,-4.25) 83(10.6,-3.75) 84(10.6,-3.25) 85(10.6,-2.75) 86(10.6,-2.25) 87(10.6,-1.75) 88(10.6,-1.25) 89(10.6,-0.75) 90(10.6,-0.25) 91(10.6,0.25) 92(10.6,0.75) 93(10.6,1.25) 94(10.6,1.75) 95(10.6,2.25) 96(10.6,2.75) 97(10.6,3.25) 98(10.6,3.75) 99(10.6,4.25) 100(10.6,4.75) 101(10.6,5.25) 102(10.6,5.75) 103(10.6,6.25) 104(10.6,6.75) 105(10.6,7.25) 106(10.6,7.75) 107(10.6,8.25) 108(10.6,8.75)
  rect 0.25x1.4 smd: 37(-8.75,-10.6) 38(-8.25,-10.6) 39(-7.75,-10.6) 40(-7.25,-10.6) 41(-6.75,-10.6) 42(-6.25,-10.6) 43(-5.75,-10.6) 44(-5.25,-10.6) 45(-4.75,-10.6) 46(-4.25,-10.6) 47(-3.75,-10.6) 48(-3.25,-10.6) 49(-2.75,-10.6) 50(-2.25,-10.6) 51(-1.75,-10.6) 52(-1.25,-10.6) 53(-0.75,-10.6) 54(-0.25,-10.6) 55(0.25,-10.6) 56(0.75,-10.6) 57(1.25,-10.6) 58(1.75,-10.6) 59(2.25,-10.6) 60(2.75,-10.6) 61(3.25,-10.6) 62(3.75,-10.6) 63(4.25,-10.6) 64(4.75,-10.6) 65(5.25,-10.6) 66(5.75,-10.6) 67(6.25,-10.6) 68(6.75,-10.6) 69(7.25,-10.6) 70(7.75,-10.6) 71(8.25,-10.6) 72(8.75,-10.6) 109(8.75,10.6) 110(8.25,10.6) 111(7.75,10.6) 112(7.25,10.6) 113(6.75,10.6) 114(6.25,10.6) 115(5.75,10.6) 116(5.25,10.6) 117(4.75,10.6) 118(4.25,10.6) 119(3.75,10.6) 120(3.25,10.6) 121(2.75,10.6) 122(2.25,10.6) 123(1.75,10.6) 124(1.25,10.6) 125(0.75,10.6) 126(0.25,10.6) 127(-0.25,10.6) 128(-0.75,10.6) 129(-1.25,10.6) 130(-1.75,10.6) 131(-2.25,10.6) 132(-2.75,10.6) 133(-3.25,10.6) 134(-3.75,10.6) 135(-4.25,10.6) 136(-4.75,10.6) 137(-5.25,10.6) 138(-5.75,10.6) 139(-6.25,10.6) 140(-6.75,10.6) 141(-7.25,10.6) 142(-7.75,10.6) 143(-8.25,10.6) 144(-8.75,10.6)
Top Overlay:
  circle w0.6: c-8.5,8.5 r0.3
  circle w0.25: c-10.6,9.425 r0.125
  lines w0.2: -9.5,-9.5 9.5,-9.5 9.5,9.5 -9.5,9.5 -9.5,-9.5
Mechanical 13:
  circle w0.1: c-9.1,9.1 r0.5
  lines w0.1: -10,-10 10,-10 10,10 -10,10 -10,-10
Mechanical 15:
  lines w0.05: -11.4,-11.4 11.4,-11.4 11.4,11.4 -11.4,11.4 -11.4,-11.4
  lines w0.1: -0.5,0 0.5,0 ; 0,-0.5 0,0.5
3D body: height 1.6, standoff 0.05, extent -10,-10 10,10

## LATC-TQFP-144_M [mm] "QFP, 144-Leads, Body 20x20mm, Pitch 0.5mm, IPC Low Density"
height 1.6
pads (144):
  rect 1.95x0.3 smd: 1(-10.65,8.75) 2(-10.65,8.25) 3(-10.65,7.75) 4(-10.65,7.25) 5(-10.65,6.75) 6(-10.65,6.25) 7(-10.65,5.75) 8(-10.65,5.25) 9(-10.65,4.75) 10(-10.65,4.25) 11(-10.65,3.75) 12(-10.65,3.25) 13(-10.65,2.75) 14(-10.65,2.25) 15(-10.65,1.75) 16(-10.65,1.25) 17(-10.65,0.75) 18(-10.65,0.25) 19(-10.65,-0.25) 20(-10.65,-0.75) 21(-10.65,-1.25) 22(-10.65,-1.75) 23(-10.65,-2.25) 24(-10.65,-2.75) 25(-10.65,-3.25) 26(-10.65,-3.75) 27(-10.65,-4.25) 28(-10.65,-4.75) 29(-10.65,-5.25) 30(-10.65,-5.75) 31(-10.65,-6.25) 32(-10.65,-6.75) 33(-10.65,-7.25) 34(-10.65,-7.75) 35(-10.65,-8.25) 36(-10.65,-8.75) 73(10.65,-8.75) 74(10.65,-8.25) 75(10.65,-7.75) 76(10.65,-7.25) 77(10.65,-6.75) 78(10.65,-6.25) 79(10.65,-5.75) 80(10.65,-5.25) 81(10.65,-4.75) 82(10.65,-4.25) 83(10.65,-3.75) 84(10.65,-3.25) 85(10.65,-2.75) 86(10.65,-2.25) 87(10.65,-1.75) 88(10.65,-1.25) 89(10.65,-0.75) 90(10.65,-0.25) 91(10.65,0.25) 92(10.65,0.75) 93(10.65,1.25) 94(10.65,1.75) 95(10.65,2.25) 96(10.65,2.75) 97(10.65,3.25) 98(10.65,3.75) 99(10.65,4.25) 100(10.65,4.75) 101(10.65,5.25) 102(10.65,5.75) 103(10.65,6.25) 104(10.65,6.75) 105(10.65,7.25) 106(10.65,7.75) 107(10.65,8.25) 108(10.65,8.75)
  rect 0.3x1.95 smd: 37(-8.75,-10.65) 38(-8.25,-10.65) 39(-7.75,-10.65) 40(-7.25,-10.65) 41(-6.75,-10.65) 42(-6.25,-10.65) 43(-5.75,-10.65) 44(-5.25,-10.65) 45(-4.75,-10.65) 46(-4.25,-10.65) 47(-3.75,-10.65) 48(-3.25,-10.65) 49(-2.75,-10.65) 50(-2.25,-10.65) 51(-1.75,-10.65) 52(-1.25,-10.65) 53(-0.75,-10.65) 54(-0.25,-10.65) 55(0.25,-10.65) 56(0.75,-10.65) 57(1.25,-10.65) 58(1.75,-10.65) 59(2.25,-10.65) 60(2.75,-10.65) 61(3.25,-10.65) 62(3.75,-10.65) 63(4.25,-10.65) 64(4.75,-10.65) 65(5.25,-10.65) 66(5.75,-10.65) 67(6.25,-10.65) 68(6.75,-10.65) 69(7.25,-10.65) 70(7.75,-10.65) 71(8.25,-10.65) 72(8.75,-10.65) 109(8.75,10.65) 110(8.25,10.65) 111(7.75,10.65) 112(7.25,10.65) 113(6.75,10.65) 114(6.25,10.65) 115(5.75,10.65) 116(5.25,10.65) 117(4.75,10.65) 118(4.25,10.65) 119(3.75,10.65) 120(3.25,10.65) 121(2.75,10.65) 122(2.25,10.65) 123(1.75,10.65) 124(1.25,10.65) 125(0.75,10.65) 126(0.25,10.65) 127(-0.25,10.65) 128(-0.75,10.65) 129(-1.25,10.65) 130(-1.75,10.65) 131(-2.25,10.65) 132(-2.75,10.65) 133(-3.25,10.65) 134(-3.75,10.65) 135(-4.25,10.65) 136(-4.75,10.65) 137(-5.25,10.65) 138(-5.75,10.65) 139(-6.25,10.65) 140(-6.75,10.65) 141(-7.25,10.65) 142(-7.75,10.65) 143(-8.25,10.65) 144(-8.75,10.65)
Top Overlay:
  circle w0.6: c-8.275,8.275 r0.3
  circle w0.25: c-10.65,9.45 r0.125
  lines w0.2: -9.275,-9.275 9.275,-9.275 9.275,9.275 -9.275,9.275 -9.275,-9.275
Mechanical 13:
  circle w0.1: c-9.1,9.1 r0.5
  lines w0.1: -10,-10 10,-10 10,10 -10,10 -10,-10
Mechanical 15:
  lines w0.05: -12.1,-12.1 12.1,-12.1 12.1,12.1 -12.1,12.1 -12.1,-12.1
  lines w0.1: -0.5,0 0.5,0 ; 0,-0.5 0,0.5
3D body: height 1.6, standoff 0.05, extent -10,-10 10,10

## LATC-TQFP-144_N [mm] "QFP, 144-Leads, Body 20x20mm, Pitch 0.5mm, IPC Medium Density"
height 1.6
pads (144):
  rect 1.65x0.3 smd: 1(-10.6,8.75) 2(-10.6,8.25) 3(-10.6,7.75) 4(-10.6,7.25) 5(-10.6,6.75) 6(-10.6,6.25) 7(-10.6,5.75) 8(-10.6,5.25) 9(-10.6,4.75) 10(-10.6,4.25) 11(-10.6,3.75) 12(-10.6,3.25) 13(-10.6,2.75) 14(-10.6,2.25) 15(-10.6,1.75) 16(-10.6,1.25) 17(-10.6,0.75) 18(-10.6,0.25) 19(-10.6,-0.25) 20(-10.6,-0.75) 21(-10.6,-1.25) 22(-10.6,-1.75) 23(-10.6,-2.25) 24(-10.6,-2.75) 25(-10.6,-3.25) 26(-10.6,-3.75) 27(-10.6,-4.25) 28(-10.6,-4.75) 29(-10.6,-5.25) 30(-10.6,-5.75) 31(-10.6,-6.25) 32(-10.6,-6.75) 33(-10.6,-7.25) 34(-10.6,-7.75) 35(-10.6,-8.25) 36(-10.6,-8.75) 73(10.6,-8.75) 74(10.6,-8.25) 75(10.6,-7.75) 76(10.6,-7.25) 77(10.6,-6.75) 78(10.6,-6.25) 79(10.6,-5.75) 80(10.6,-5.25) 81(10.6,-4.75) 82(10.6,-4.25) 83(10.6,-3.75) 84(10.6,-3.25) 85(10.6,-2.75) 86(10.6,-2.25) 87(10.6,-1.75) 88(10.6,-1.25) 89(10.6,-0.75) 90(10.6,-0.25) 91(10.6,0.25) 92(10.6,0.75) 93(10.6,1.25) 94(10.6,1.75) 95(10.6,2.25) 96(10.6,2.75) 97(10.6,3.25) 98(10.6,3.75) 99(10.6,4.25) 100(10.6,4.75) 101(10.6,5.25) 102(10.6,5.75) 103(10.6,6.25) 104(10.6,6.75) 105(10.6,7.25) 106(10.6,7.75) 107(10.6,8.25) 108(10.6,8.75)
  rect 0.3x1.65 smd: 37(-8.75,-10.6) 38(-8.25,-10.6) 39(-7.75,-10.6) 40(-7.25,-10.6) 41(-6.75,-10.6) 42(-6.25,-10.6) 43(-5.75,-10.6) 44(-5.25,-10.6) 45(-4.75,-10.6) 46(-4.25,-10.6) 47(-3.75,-10.6) 48(-3.25,-10.6) 49(-2.75,-10.6) 50(-2.25,-10.6) 51(-1.75,-10.6) 52(-1.25,-10.6) 53(-0.75,-10.6) 54(-0.25,-10.6) 55(0.25,-10.6) 56(0.75,-10.6) 57(1.25,-10.6) 58(1.75,-10.6) 59(2.25,-10.6) 60(2.75,-10.6) 61(3.25,-10.6) 62(3.75,-10.6) 63(4.25,-10.6) 64(4.75,-10.6) 65(5.25,-10.6) 66(5.75,-10.6) 67(6.25,-10.6) 68(6.75,-10.6) 69(7.25,-10.6) 70(7.75,-10.6) 71(8.25,-10.6) 72(8.75,-10.6) 109(8.75,10.6) 110(8.25,10.6) 111(7.75,10.6) 112(7.25,10.6) 113(6.75,10.6) 114(6.25,10.6) 115(5.75,10.6) 116(5.25,10.6) 117(4.75,10.6) 118(4.25,10.6) 119(3.75,10.6) 120(3.25,10.6) 121(2.75,10.6) 122(2.25,10.6) 123(1.75,10.6) 124(1.25,10.6) 125(0.75,10.6) 126(0.25,10.6) 127(-0.25,10.6) 128(-0.75,10.6) 129(-1.25,10.6) 130(-1.75,10.6) 131(-2.25,10.6) 132(-2.75,10.6) 133(-3.25,10.6) 134(-3.75,10.6) 135(-4.25,10.6) 136(-4.75,10.6) 137(-5.25,10.6) 138(-5.75,10.6) 139(-6.25,10.6) 140(-6.75,10.6) 141(-7.25,10.6) 142(-7.75,10.6) 143(-8.25,10.6) 144(-8.75,10.6)
Top Overlay:
  circle w0.6: c-8.375,8.375 r0.3
  circle w0.25: c-10.6,9.45 r0.125
  lines w0.2: -9.375,-9.375 9.375,-9.375 9.375,9.375 -9.375,9.375 -9.375,-9.375
Mechanical 13:
  circle w0.1: c-9.1,9.1 r0.5
  lines w0.1: -10,-10 10,-10 10,10 -10,10 -10,-10
Mechanical 15:
  lines w0.05: -11.65,-11.65 11.65,-11.65 11.65,11.65 -11.65,11.65 -11.65,-11.65
  lines w0.1: -0.5,0 0.5,0 ; 0,-0.5 0,0.5
3D body: height 1.6, standoff 0.05, extent -10,-10 10,10